# Altium footprint library LUMI_Standard_Auto_Soldering_LIB.PcbLib: 344 footprints (part 20 of 22)
Each footprint in its own frame and in the unit in brackets; x right, y up, seen from the top. Pads: shape width x height; smd on the part's side, far side on the other; paste and mask are expansions set on the pad; w line width, h text height; cw(c..) or ccw(c..) is an arc to the next point about the centre after c.
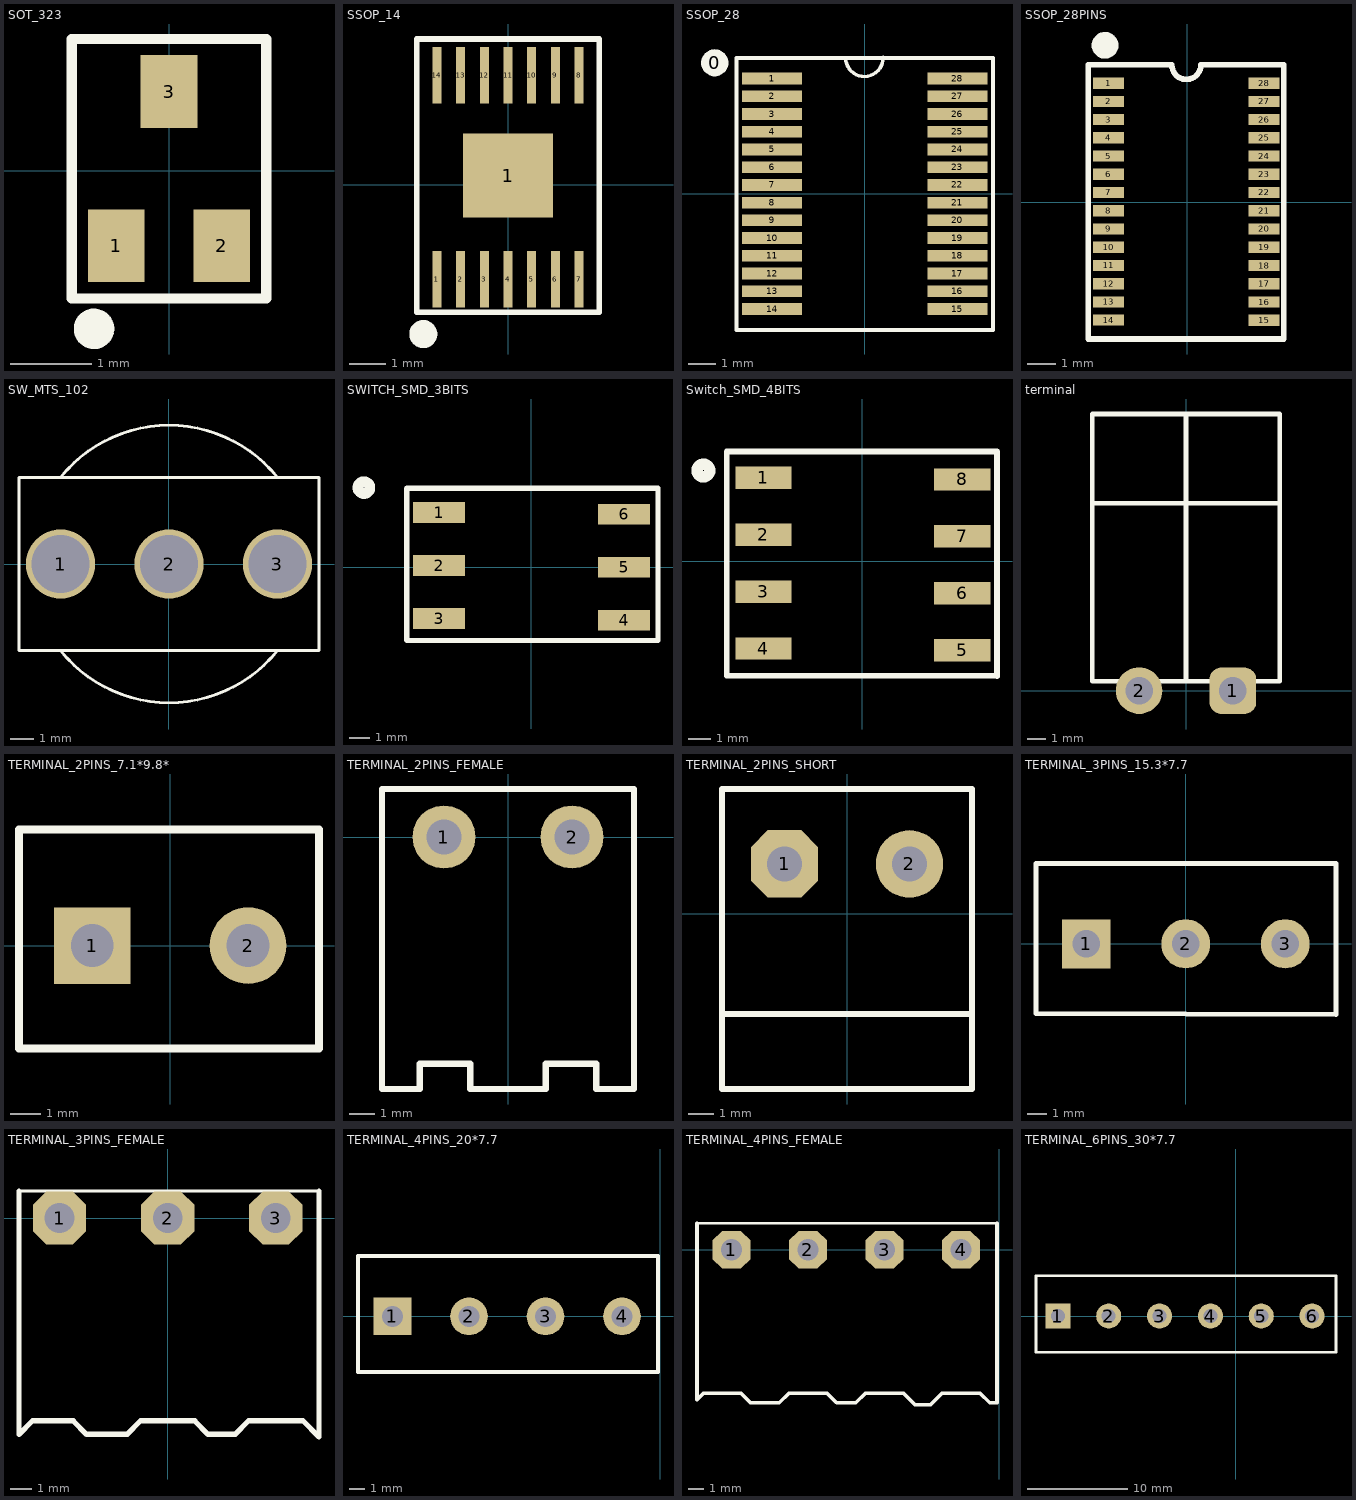
[diagram p19: the footprints below, top view; thin cyan lines are the x and y axes]

## SOT_323 [mm]
pads (3):
  rect 0.7x0.9 smd: 1(-0.65,-0.925) 2(0.65,-0.925) 3(0,0.975)
Top Overlay:
  circle w0.25: c-0.925,-1.95 r0.125
  lines w0.127: -1.2,-1.575 1.2,-1.575 1.2,1.625 -1.2,1.625 -1.2,-1.575
3D body: height 0.9, standoff 0, extent -1.05,-1.025 1.05,1.075

## SSOP_14 [mm]
pads (15):
  rect 0.25x1.55 smd: 1(-1.95,-2.6) 2(-1.3,-2.6) 3(-0.65,-2.6) 4(0,-2.6) 5(0.65,-2.6) 6(1.3,-2.6) 7(1.95,-2.6) 8(1.95,3) 9(1.3,3) 10(0.65,3) 11(0,3) 12(-0.65,3) 13(-1.3,3) 14(-1.95,3)
  rect 2.46x2.31 smd: 1(0,0.25)
Top Overlay:
  circle w0.5: c-2.325,-4.1 r0.135
  lines w0.152: -2.5,-3.5 -2.5,4 2.5,4 2.5,-3.5 -2.5,-3.5
3D body: height 1.73, standoff -0.08, extent -2.5,-2.75 2.5,3.25

## SSOP_28 [mm]
pads (29):
  round 1 on Top Overlay: 0(-5.5,4.8)
  rect 2.2x0.43 smd: 1(-3.4,4.225) 2(-3.4,3.575) 3(-3.4,2.925) 4(-3.4,2.275) 5(-3.4,1.625) 6(-3.4,0.975) 7(-3.4,0.325) 8(-3.4,-0.325) 9(-3.4,-0.975) 10(-3.4,-1.625) 11(-3.4,-2.275) 12(-3.4,-2.925) 13(-3.4,-3.575) 14(-3.4,-4.225) 15(3.4,-4.225) 16(3.4,-3.575) 17(3.4,-2.925) 18(3.4,-2.275) 19(3.4,-1.625) 20(3.4,-0.975) 21(3.4,-0.325) 22(3.4,0.325) 23(3.4,0.975) 24(3.4,1.625) 25(3.4,2.275) 26(3.4,2.925) 27(3.4,3.575) 28(3.4,4.225)
Top Overlay:
  lines w0.127: -0.7,4.975 ccw(c-0.013,4.987) 0,4.3 ccw(c-0.012,4.987) 0.675,5
  lines w0.152: -4.7,-5 -4.7,4.975 4.7,4.975 4.7,-5 -4.7,-5
3D body: height 1.75, standoff 0, extent -3.094,-4.991 3.094,4.991

## SSOP_28PINS [mm]
pads (28):
  rect 1.1x0.4 smd mask+0: 1(-2.8,4.25) 2(-2.8,3.6) 3(-2.8,2.95) 4(-2.8,2.3) 5(-2.8,1.65) 6(-2.8,1) 7(-2.8,0.35) 8(-2.8,-0.3) 9(-2.8,-0.95) 10(-2.8,-1.6) 11(-2.8,-2.252) 12(-2.8,-2.902) 13(-2.8,-3.552) 14(-2.8,-4.202) 15(2.75,-4.207) 16(2.75,-3.557) 17(2.75,-2.907) 18(2.75,-2.257) 19(2.75,-1.6) 20(2.75,-0.95) 21(2.75,-0.3) 22(2.75,0.35) 23(2.75,1) 24(2.75,1.65) 25(2.75,2.3) 26(2.75,2.95) 27(2.75,3.6) 28(2.75,4.25)
Top Overlay:
  circle w0.5: c-2.925,5.6 r0.225
  lines w0.2: -3.525,-4.875 3.45,-4.875 3.45,4.9 0.491,4.9 cw(c-0.025,4.9) -0.542,4.9 -3.525,4.9 -3.525,-4.875
3D body: height -0.34, standoff -1.33, extent -3.225,-4.8 3.175,4.9

## SW_MTS_102 [mm]
pads (3):
  round 3 hole 2.5: 1(-4.7,0) 2(0,0) 3(4.7,0)
Top Overlay:
  lines w0.127: -4.7,-3.75 ccw(c0,0) 4.7,-3.75 ; -4.7,3.75 cw(c0,0) 4.7,3.75 ; -6.5,-3.75 6.5,-3.75 6.5,3.75 -6.5,3.75 -6.5,-3.75
3D body: height 4, standoff -4, extent -5.7,-0.5 -3.7,0.5
3D body: height 4, standoff -4, extent -1,-0.5 1,0.5
3D body: height 4, standoff -4, extent 3.7,-0.5 5.7,0.5
3D body: height 30, standoff 20, extent -1.488,-1.497 1.5,1.497
3D body: height 20, standoff 10, extent -2.976,-2.994 3,2.994
3D body: height 11, standoff 10, extent -5.953,-5.988 6,5.988
3D body: height 10, standoff 0, extent -6.5,-3.8 6.5,3.8

## SWITCH_SMD_3BITS [mm]
pads (6):
  rect 2.5x1 smd: 1(-4.42,2.63) 2(-4.42,0.09) 3(-4.42,-2.45) 4(4.45,-2.53) 5(4.45,0.01) 6(4.45,2.55)
Top Overlay:
  circle w0.508: c-8.025,3.825 r0.283
  lines w0.254: -5.975,-3.475 -5.95,-3.5 -4.7,-3.5 4.7,-3.5 6.075,-3.5 6.075,3.8 4.7,3.8 -4.7,3.8 -5.95,3.8 -5.975,3.775 -5.975,-3.475

## Switch_SMD_4BITS [mm]
pads (8):
  rect 2.5x1 smd: 1(-4.42,3.73) 2(-4.42,1.19) 3(-4.42,-1.35) 4(-4.42,-3.89) 5(4.45,-3.97) 6(4.45,-1.43) 7(4.45,1.11) 8(4.45,3.65)
Top Overlay:
  circle w0.508: c-7.1,4.05 r0.283
  lines w0.254: -6.05,-5.1 -6.05,4.9 -4.7,4.9 4.7,4.9 6,4.9 6,-5.125 5.975,-5.1 4.7,-5.1 -4.7,-5.1 -6.05,-5.1
3D body: height 2.93, standoff 0.02, extent -4.65,-5.105 4.65,4.905

## terminal [mm]
pads (2):
  rrect50% 2.524x2.524 hole 1.5: 1(2.54,0)
  round 2.524 hole 1.5: 2(-2.54,0)
Top Overlay:
  lines w0.254: -5.08,10.16 5.08,10.16 ; 0,0.508 0,14.986 ; -5.08,0.508 5.08,0.508 5.08,14.986 -5.08,14.986 -5.08,13.97 -5.08,0.508
3D body: height 3, standoff -9.5, extent -5.55,-0.388 5,14.008

## TERMINAL_2PINS_7.1*9.8* [mm]
pads (2):
  rect 2.5x2.5 hole 1.397: 1(-2.54,0)
  round 2.5 hole 1.397: 2(2.54,0)
Top Overlay:
  lines w0.254: -4.928,-3.353 -4.928,3.785 4.851,3.785 4.851,-3.353 -4.928,-3.353
3D body: height 10, standoff -4, extent -5.055,-3.505 4.945,3.995

## TERMINAL_2PINS_FEMALE [mm]
pads (2):
  round 2.5 hole 1.397: 1(-2.54,0) 2(2.54,0)
Top Overlay:
  lines w0.254: 5,-10 3.5,-10 3.5,-9 1.5,-9 1.5,-10 -1.5,-10 -1.5,-9 -3.5,-9 -3.5,-10 -5,-10 -5,-5.635 -5,1.905 5,1.905 5,-9.945
3D body: height 8.77, standoff -3.7, extent -5.04,-10.273 4.96,1.727

## TERMINAL_2PINS_SHORT [mm]
pads (2):
  oct 2.7x2.7 hole 1.397: 1(-2.5,2)
  round 2.7 hole 1.397: 2(2.5,2)
Top Overlay:
  lines w0.254: -5,-4 5,-4 ; -5,-7 5,-7 5,5 -5,5 -5,-7
3D body: height 9, standoff -3.8, extent -5.612,-7.367 5.588,5.233

## TERMINAL_3PINS_15.3*7.7 [mm] "hkgvh"
pads (3):
  rect 2.5x2.5 hole 1.4: 1(-5.08,0)
  round 2.5 hole 1.4: 2(0,0) 3(5.08,0)
Top Overlay:
  lines w0.254: -7.645,-3.548 -7.645,4.089 7.671,4.089 7.671,-3.596 -7.645,-3.548
3D body: height 10, standoff -4, extent -7.475,-3.436 7.525,4.064

## TERMINAL_3PINS_FEMALE [mm] "hkgvh"
pads (3):
  oct 2.5x2.5 hole 1.4: 1(-5.08,0) 2(0,0) 3(5.08,0)
Top Overlay:
  lines w0.15: -6.985,1.27 7.112,1.27
  lines w0.254: -6.985,1.27 -6.985,-10.16 -6.35,-9.525 -4.445,-9.525 -3.81,-10.16 -1.905,-10.16 -1.27,-9.525 1.27,-9.525 1.905,-10.16 3.175,-10.16 3.81,-9.525 6.35,-9.525 7.112,-10.287 7.112,1.27
3D body: height 8.47, standoff -4, extent -2.525,-10.273 7.475,1.727
3D body: height 8.47, standoff -4, extent -7.544,-10.267 2.456,1.733

## TERMINAL_4PINS_20*7.7 [mm] "hkgvh"
pads (4):
  rect 2.5x2.5 hole 1.4: 1(-17.78,0)
  round 2.5 hole 1.4: 2(-12.7,0) 3(-7.62,0) 4(-2.54,0)
Top Overlay:
  lines w0.254: -20.066,-3.697 -0.279,-3.697 -0.279,-3.683 -0.152,-3.683 -0.152,4.013 -20.066,4.013 -20.066,0.86 -20.066,-0.111 -20.066,-1.206 -20.066,-3.697
3D body: height 10, standoff -4, extent -10.156,-3.531 -0.156,3.969
3D body: height 10, standoff -4, extent -20.033,-3.531 -10.033,3.969

## TERMINAL_4PINS_FEMALE [mm] "hkgvh"
pads (4):
  oct 2.5x2.5 hole 1.4: 1(-17.78,0) 2(-12.7,0) 3(-7.62,0) 4(-2.54,0)
Top Overlay:
  lines w0.15: -20.066,1.753 -0.152,1.753
  lines w0.254: -20.066,1.753 -20.066,0.86 -20.066,-0.111 -20.066,-1.206 -20.066,-6.921 -20.066,-9.957 -19.634,-9.525 -17.145,-9.525 -16.51,-10.16 -14.605,-10.16 -13.97,-9.525 -11.43,-9.525 -10.795,-10.16 -9.525,-10.16 -8.89,-9.525 -6.35,-9.525 -5.588,-10.287 -4.572,-10.287 -3.81,-9.525 -1.27,-9.525 -0.635,-10.16 -0.152,-10.16 -0.152,1.753
3D body: height 8.47, standoff -4, extent -20.153,-10.222 -10.153,1.778
3D body: height 8.47, standoff -4, extent -10.094,-10.222 -0.094,1.778

## TERMINAL_6PINS_30*7.7 [mm] "hkgvh"
pads (6):
  rect 2.5x2.5 hole 1.4: 1(-17.78,0)
  round 2.5 hole 1.4: 2(-12.7,0) 3(-7.62,0) 4(-2.54,0) 5(2.54,0) 6(7.62,0)
Top Overlay:
  lines w0.254: -19.964,-3.607 10.008,-3.607 10.008,4.013 -19.964,4.013 -19.964,-3.607
3D body: height 10, standoff -4, extent -0.127,-3.538 9.873,3.962
3D body: height 10, standoff -4, extent -10.004,-3.538 -0.004,3.962
3D body: height 10, standoff -4, extent -19.881,-3.563 -9.881,3.937